# Altium footprint library THU VIEN PCB.PCBLib: 534 footprints (part 26 of 34)
Each footprint in its own frame and in the unit in brackets; x right, y up, seen from the top. Pads: shape width x height; smd on the part's side, far side on the other; paste and mask are expansions set on the pad; w line width, h text height; cw(c..) or ccw(c..) is an arc to the next point about the centre after c.
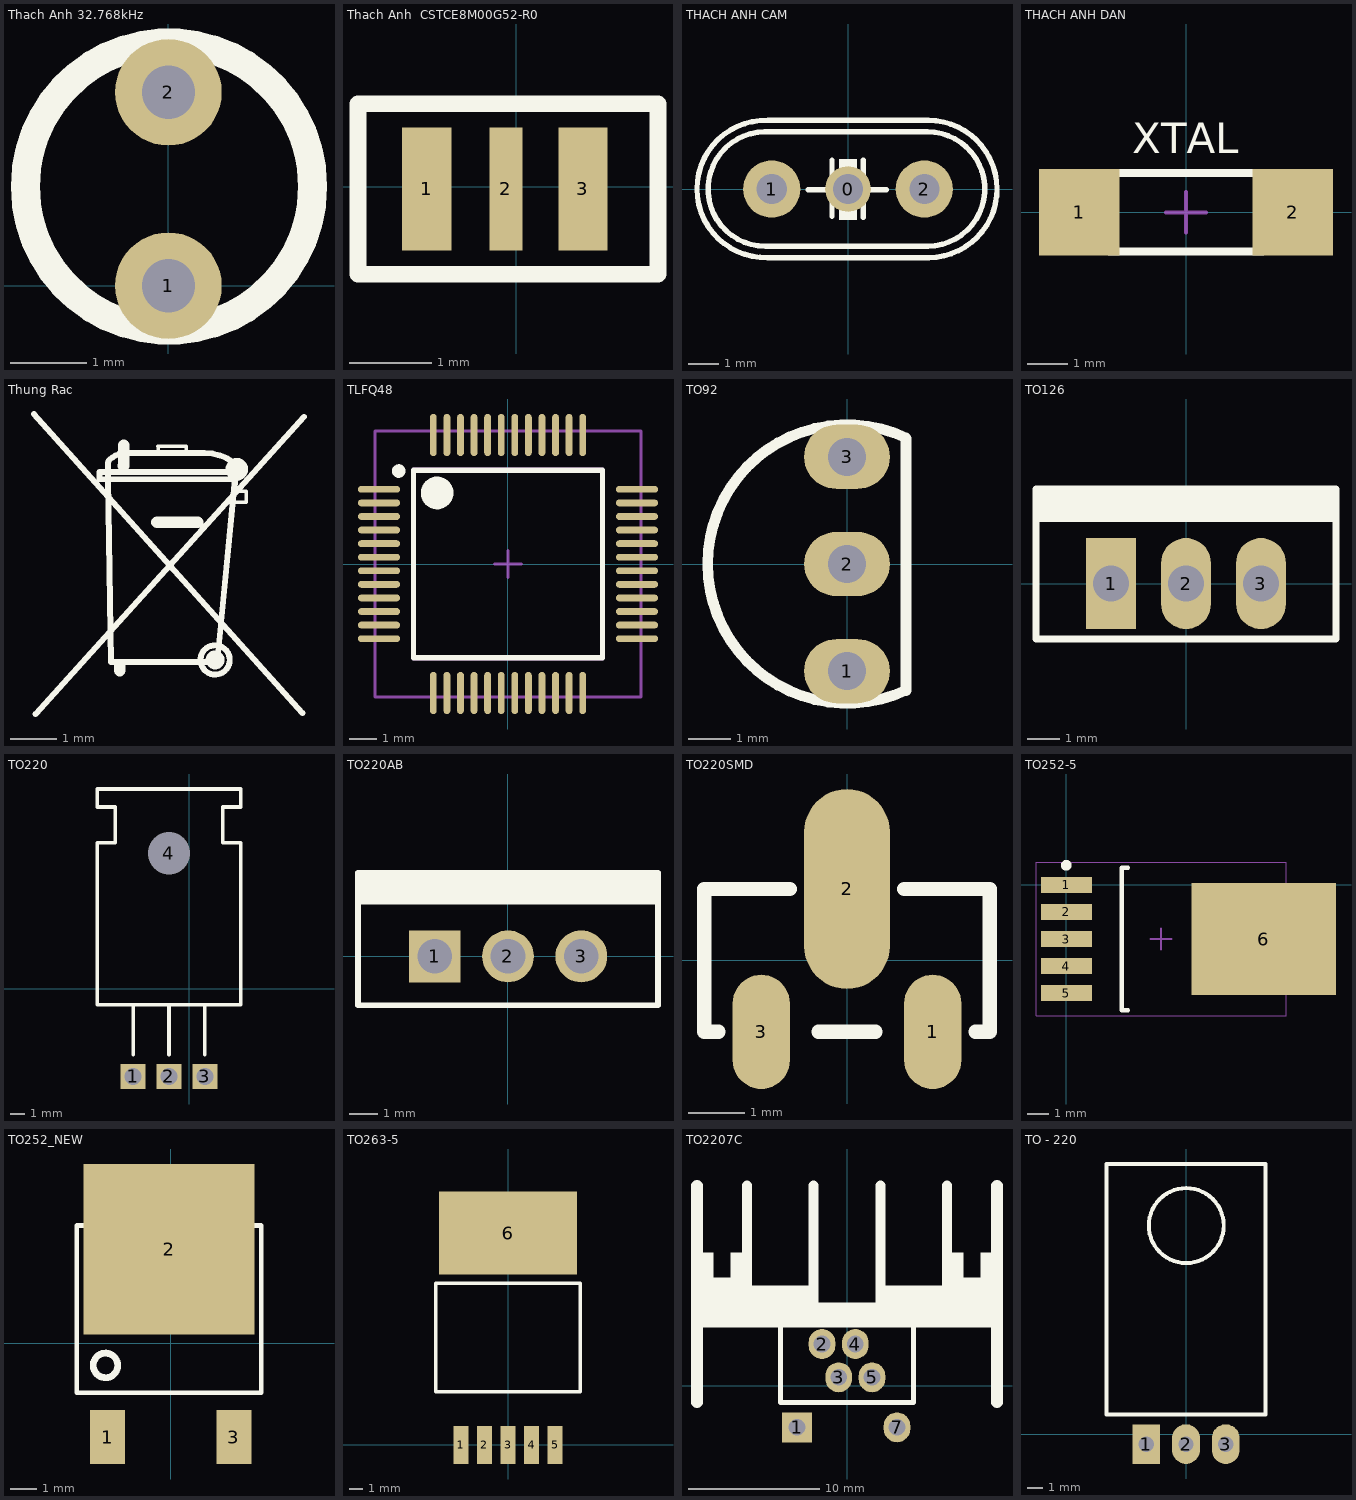
[diagram p25: the footprints below, top view; thin cyan lines are the x and y axes]

## Thach Anh 32.768kHz [mm]
height 3.81
pads (2):
  round 1.4 hole 0.7: 1(0,0) 2(0,2.54)
Top Overlay:
  circle w0.381: c0.008,1.303 r1.887
3D body "32.768khz.step": height 8.27, standoff -2.5, extent -1.549,-0.455 1.651,2.995

## Thach Anh  CSTCE8M00G52-R0 [mm]
pads (3):
  rect 0.6x1.5 smd: 1(-1.092,-0.025) 3(0.813,-0.025)
  rect 0.4x1.5 smd: 2(-0.127,-0.025)
Top Overlay:
  lines w0.203: -1.93,-1.067 -1.93,1.016 0.635,1.016 1.727,1.016 1.727,-1.067 -1.93,-1.067
3D body: height 1.02, standoff -0.09, extent -1.727,-0.686 1.473,0.614

## THACH ANH CAM [mm] "Footpin for Crystal 2 pin"
pads (3):
  round 1.524 hole 1: 0(0,0)
  round 1.905 hole 1: 1(-2.54,0) 2(2.54,0)
Top Overlay:
  region: 0.292,0.991 0.292,-1.016 -0.292,-1.016 -0.292,0.991
  lines w0.178: -2.769,1.905 ccw(c-2.756,0) -2.75,-1.905 ; -2.717,-1.905 2.617,-1.905 ; -2.692,1.905 2.642,1.905 ; -2.668,-2.286 2.69,-2.286 ccw(c2.675,0) 2.668,2.286 -2.666,2.286 ccw(c-2.743,0.001) -2.668,-2.283 ; -1.321,-0.025 -0.533,-0.025 ; -0.533,-0.914 -0.533,0.965 ; 0.508,-0.94 0.508,0.965 ; 0.508,-0.025 1.27,-0.025 ; 2.642,1.905 cw(c2.647,0) 2.66,-1.905
3D body "SW3dPS-HP49US.STEP": height 3.5, standoff -4, extent -5.929,-2.364 5.421,2.286

## THACH ANH DAN [mm] "Thach Anh Dan 5.08mm"
height 3
pads (2):
  rect 2x2.15 smd: 1(-2.65,0) 2(2.65,0)
Top Overlay:
  lines w0.2: -1.9,-0.975 1.9,-0.975 ; -1.9,0.975 1.9,0.975
  text "XTAL" at -1.333,1.473 h0.76
Mechanical 13:
  lines w0.1: -2.54,-1 2.54,-1 2.54,1 -2.54,1 -2.54,-1
Mechanical 15:
  lines w0.1: -0.5,0 0.5,0 ; 0,-0.5 0,0.5
3D body: height 3, standoff 0, extent -2.54,-1 2.54,1

## Thung Rac [mm]
Top Overlay:
  circle w0.381: c7.244,6.043 r0.053
  circle w0.127: c6.772,1.9 r0.319
  circle w0.254: c6.772,1.9 r0.077
  lines w0.076: 5.527,6.538 5.532,6.538 5.532,6.393 ; 5.537,6.546 6.144,6.546 6.149,6.546 6.149,6.393 ; 7.158,5.324 7.452,5.324 7.452,5.568 7.17,5.568
  lines w0.127: 2.832,7.244 8.669,0.744 ; 2.87,0.724 8.707,7.186 ; 4.442,5.832 4.506,1.852 6.82,1.852 7.206,5.827 4.262,5.827 4.262,5.984 7.244,5.984 7.183,5.596 ; 4.445,5.801 4.445,6.165 cw(c4.566,6.165) 4.481,6.251 cw(c4.83,5.901) 4.83,6.396 6.545,6.396 cw(c6.545,5.32) 7.305,6.081
  lines w0.254: 4.699,1.669 4.699,1.753 ; 4.78,6.116 4.785,6.116 4.785,6.563 ; 5.509,4.895 6.393,4.895

## TLFQ48 [mm] "48-Pin Thin Quad Flat Pack 0.5 mm Pitch, IPC High Density"
height 1.6
pads (48):
  oval 1.55x0.25 smd: 1(-4.75,2.75) 2(-4.75,2.25) 3(-4.75,1.75) 4(-4.75,1.25) 5(-4.75,0.75) 6(-4.75,0.25) 7(-4.75,-0.25) 8(-4.75,-0.75) 9(-4.75,-1.25) 10(-4.75,-1.75) 11(-4.75,-2.25) 12(-4.75,-2.75) 25(4.75,-2.75) 26(4.75,-2.25) 27(4.75,-1.75) 28(4.75,-1.25) 29(4.75,-0.75) 30(4.75,-0.25) 31(4.75,0.25) 32(4.75,0.75) 33(4.75,1.25) 34(4.75,1.75) 35(4.75,2.25) 36(4.75,2.75)
  oval 0.25x1.55 smd: 13(-2.75,-4.75) 14(-2.25,-4.75) 15(-1.75,-4.75) 16(-1.25,-4.75) 17(-0.75,-4.75) 18(-0.25,-4.75) 19(0.25,-4.75) 20(0.75,-4.75) 21(1.25,-4.75) 22(1.75,-4.75) 23(2.25,-4.75) 24(2.75,-4.75) 37(2.75,4.75) 38(2.25,4.75) 39(1.75,4.75) 40(1.25,4.75) 41(0.75,4.75) 42(0.25,4.75) 43(-0.25,4.75) 44(-0.75,4.75) 45(-1.25,4.75) 46(-1.75,4.75) 47(-2.25,4.75) 48(-2.75,4.75)
Top Overlay:
  circle w0.25: c-4.025,3.425 r0.125
  circle w0.6: c-2.611,2.616 r0.3
  lines w0.2: -3.48,-3.454 -3.48,3.454 3.48,3.454 3.48,-3.454 -3.48,-3.454
Mechanical 13:
  circle w0.1: c-2.6,2.6 r0.5
  lines w0.1: -3.5,-3.5 -3.5,3.5 3.5,3.5 3.5,-3.5 -3.5,-3.5
Mechanical 15:
  lines w0.1: -0.5,0 0.5,0 ; 0,-0.5 0,0.5 ; -4.9,-4.9 -4.9,4.9 4.9,4.9 4.9,-4.9 -4.9,-4.9
3D body: height 1.6, standoff 0, extent -3.5,-3.5 3.5,3.5

## TO92 [mil] "TO, Flat Index; 3 In-Line, Axial Leads; Body Dia. 4.8mm"
pads (3):
  oval 80x60 hole 35.43: 1(0,-100) 2(0,0) 3(0,100)
Top Overlay:
  lines w10: 54.92,-117.83 cw(c0,0) 54.92,117.83 ; 55,-118 55,117
3D body "TO92.step": height 335.64, standoff -109.19, extent -95,-103.87 65.56,113.87

## TO126 [mil] "TO, Thru-Hole, Vertical, Heatsink Mounted; 3 In-Line Leads; Pitch 2.54 mm; Pin sequence 1, 3, 2"
height 645.67
pads (3):
  rect 60x110 hole 43.31: 1(-90.55,0)
  oval 60x110 hole 43.31: 2(0,0) 3(90.55,0)
Top Overlay:
  rectangle: -181.1,74.49 181.1,114.17
  lines w7.87: -181.1,-66.93 -181.1,114.17 181.1,114.17 181.1,-66.93 -181.1,-66.93

## TO220 [mm]
pads (4):
  rect 1.778x1.778 hole 1.2 unplated: 1(-3.958,-6.21) 2(-1.418,-6.21) 3(1.122,-6.21)
  round 1.778 hole 3 unplated: 4(-1.418,9.57)
Top Overlay:
  lines w0.254: -3.958,-4.686 -3.958,-1.13 ; -1.418,-4.686 -1.418,-1.13 ; 1.122,-4.686 1.122,-1.13 ; -6.498,-1.13 -6.498,10.3 -5.228,10.3 -5.228,12.84 -6.498,12.84 -6.498,14.11 3.662,14.11 3.662,12.84 2.392,12.84 2.392,10.3 3.662,10.3 3.662,-1.13 -6.498,-1.13

## TO220AB [mm] "TO, Thru-Hole, Vertical, Heatsink Mounted; 3 In-Line Leads; Pitch 2.54 mm; Pin sequence 1, 3, 2"
height 16.4
pads (3):
  rect 1.8x1.8 hole 1.2: 1(-2.54,0)
  round 1.8 hole 1.2: 2(0,0) 3(2.54,0)
Top Overlay:
  rectangle: -5.2,1.892 5.2,2.9
  lines w0.2: -5.2,1.892 5.2,1.892 ; -5.2,-1.7 5.2,-1.7 5.2,2.9 -5.2,2.9 -5.2,-1.7

## TO220SMD [mil]
pads (3):
  oval 40x80 smd: 1(60,-50) 3(-60,-50)
  oval 60x140 smd: 2(0,50)
Top Overlay:
  lines w10: -90,-50 -100,-50 -100,50 -60,50 -40,50 ; -20,-50 20,-50 ; 40,50 100,50 100,-50 90,-50

## TO252-5 [mm]
pads (6):
  rect 2.4x0.75 smd: 1(0,0) 2(0,-1.27) 3(0,-2.54) 4(0,-3.81) 5(0,-5.08)
  rect 6.8x5.25 smd: 6(9.271,-2.54)
Top Overlay:
  circle w0.25: c0,0.925 r0.125
  lines w0.2: 2.9,-5.89 2.6,-5.89 2.6,0.81 2.9,0.81
Mechanical 15:
  lines w0.05: -1.425,-6.14 10.325,-6.14 10.325,1.06 -1.425,1.06 -1.425,-6.14
  lines w0.1: 3.95,-2.54 4.95,-2.54 ; 4.45,-3.04 4.45,-2.04
3D body "User Library-DPAK-5-1.step": height 2.42, standoff 0.01, extent -0.254,-5.938 10.612,0.762

## TO252_NEW [mil]
pads (3):
  rect 51.18x78.74 smd: 1(-92.5,-137.5) 3(92.5,-137.5)
  rect 250x250 smd: 2(-2.5,137.5)
Top Overlay:
  circle w10: c-95.53,-32.5 r18.03
  lines w7: -137.5,-72.5 -137.5,172.5 132.5,172.5 132.5,-72.5 -112.5,-72.5 -137.5,-72.5
3D body "TO-252.step": height 91.15, standoff 0.6, extent -132.03,-162.98 127.02,218.91

## TO263-5 [mm] "LM2576-SMD"
pads (6):
  rect 1.07x2.75 smd: 1(-3.4,-0.025) 2(-1.7,-0.025) 3(0,-0.025) 4(1.7,-0.025) 5(3.4,-0.025)
  rect 10x6 smd: 6(0,15.289)
Top Overlay:
  lines w0.254: -5.207,3.81 5.207,3.81 5.207,11.684 -5.207,11.684 -5.207,3.81
3D body "SW3dPS-TO263-5.STEP": height 4.79, standoff -0.01, extent -5,-0.381 5,15.289

## TO2207C [mil] "DIP; 7 Leads; Row Spacing 7.62 mm; Pitch 2.54 mm"
height 209.84
pads (6):
  rect 90x90 hole 50: 1(-150,-125)
  oval 80x90 hole 50: 2(-75,125) 3(-25,25) 4(25,125) 5(75,25) 7(150,-125)
Top Overlay:
  rectangle: -450,175 450,250
  rectangle: -450,225 -300,325
  rectangle: 300,225 450,325
  rectangle: -300,225 -100,300
  rectangle: 100,225 300,300
  rectangle: 300,325 350,400
  rectangle: 400,300 450,400
  rectangle: -450,300 -400,400
  rectangle: -350,300 -300,400
  lines w15: -200,225 -200,-50 200,-50 200,205
  lines w30: -300,225 -300,600 ; -100,225 -100,600 ; 100,225 100,600 ; 300,250 300,600
  lines w35: -450,-50 -450,600 ; 450,-50 450,600

## TO - 220 [mil]
pads (3):
  rect 70x100 hole 39: 1(-100,-25)
  oval 70x100 hole 39: 2(0,-25) 3(100,-25)
Top Overlay:
  circle w10: c0.66,525 r94.34
  lines w10: 199,50 -200,50 -200,680 200,680 200,50
3D body "TO 220 N.step": height 177.77, standoff -145.07, extent -193.7,-27.88 200,747.88